# Altium footprint library TO系列封装.PcbLib: 22 footprints (part 1 of 2)
Each footprint in its own frame and in the unit in brackets; x right, y up, seen from the top. Pads: shape width x height; smd on the part's side, far side on the other; paste and mask are expansions set on the pad; w line width, h text height; cw(c..) or ccw(c..) is an arc to the next point about the centre after c.
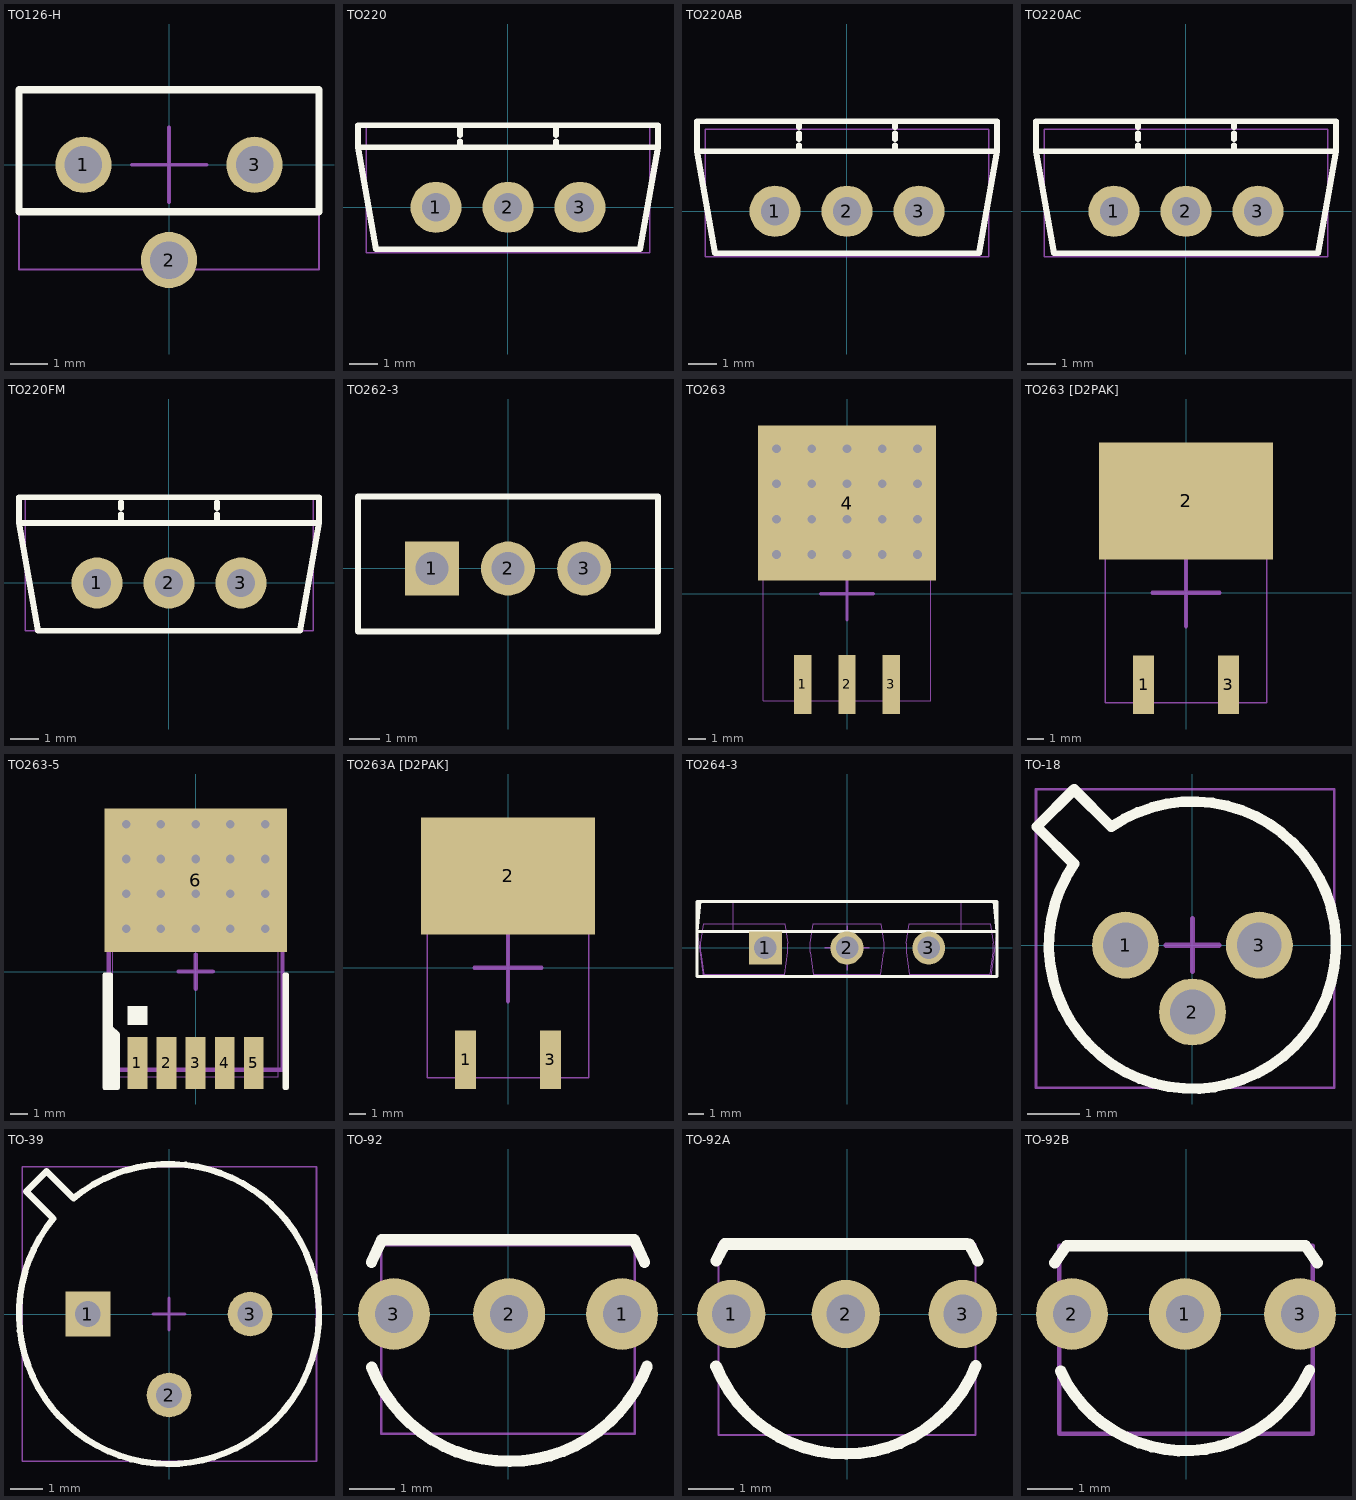
[diagram p0: the footprints below, top view; thin cyan lines are the x and y axes]

## TO126-H [mm] "SOT-32 [TO-126]晶体管"
height 15
pads (3):
  round 1.5 hole 1: 1(-2.28,0) 2(0,-2.54) 3(2.28,0)
Top Overlay:
  lines w0.2: -4,-1.25 4,-1.25 4,2 -4,2 -4,-1.25
Mechanical 13:
  lines w0.05: -4,-2.79 4,-2.79 4,2 -4,2 -4,-2.79
Mechanical 15:
  lines w0.1: -0.991,0 1,0 ; 0,-1 0,1
3D body "to126-cut5-c.stp": height 15.5, standoff -3.5, extent -4,-2.79 4,2

## TO220 [mm]
height 28
pads (3):
  round 1.8 hole 1: 1(-2.54,0) 2(0,0) 3(2.54,0)
Top Overlay:
  lines w0.2: -1.693,2.117 -1.693,2.328 ; -1.693,2.54 -1.693,2.752 ; 1.693,2.117 1.693,2.328 ; 1.693,2.54 1.693,2.752 ; -5.292,2.117 -5.292,2.896 5.292,2.896 5.292,2.117 ; -5.292,2.117 -4.657,-1.482 4.657,-1.482 5.292,2.117 ; -5.292,2.117 5.292,2.117
Mechanical 13:
  lines w0.05: -5,-1.604 5,-1.604 5,2.896 -5,2.896 -5,-1.604
3D body "to220-3p.stp": height 23.7, standoff -5.08, extent -5,-1.604 5,2.896

## TO220AB [mm]
height 28
pads (3):
  round 1.8 hole 1: 1(-2.54,0) 2(0,0) 3(2.54,0)
Top Overlay:
  lines w0.2: -1.693,2.117 -1.693,2.328 ; -1.693,2.54 -1.693,2.752 ; -1.693,2.963 -1.693,3.175 ; 1.693,2.117 1.693,2.328 ; 1.693,2.54 1.693,2.752 ; 1.693,2.963 1.693,3.175 ; -5.292,2.117 5.292,2.117 ; -5.292,2.117 -4.657,-1.482 4.657,-1.482 5.292,2.117 ; -5.292,2.117 -5.292,3.175 5.292,3.175 5.292,2.117
Mechanical 13:
  lines w0.05: -5,-1.604 -5,2.896 5,2.896 5,-1.604 -5,-1.604
3D body "to220ab-3p.stp": height 23.5, standoff -5, extent -5,-1.604 5.2,2.896

## TO220AC [mm]
height 28
pads (3):
  round 1.8 hole 1: 1(-2.54,0) 2(0,0) 3(2.54,0)
Top Overlay:
  lines w0.2: -1.693,2.117 -1.693,2.328 ; -1.693,2.54 -1.693,2.752 ; -1.693,2.963 -1.693,3.175 ; 1.693,2.117 1.693,2.328 ; 1.693,2.54 1.693,2.752 ; 1.693,2.963 1.693,3.175 ; -5.292,2.117 -5.292,3.175 5.292,3.175 5.292,2.117 ; -5.292,2.117 -4.657,-1.482 4.657,-1.482 5.292,2.117 ; -5.292,2.117 5.292,2.117
Mechanical 13:
  lines w0.05: -5,-1.604 5,-1.604 5,2.896 -5,2.896 -5,-1.604
3D body "to220ac-3p.stp": height 23.7, standoff -5.08, extent -5,-1.604 5,2.896

## TO220FM [mm]
height 28
pads (3):
  round 1.8 hole 1: 1(-2.54,0) 2(0,0) 3(2.54,0)
Top Overlay:
  lines w0.2: -1.693,2.218 -1.693,2.43 ; -1.693,2.642 -1.693,2.853 ; 1.693,2.218 1.693,2.43 ; 1.693,2.642 1.693,2.853 ; -5.292,2.117 -5.292,3.019 5.292,3.019 5.292,2.117 ; -5.292,2.117 -4.622,-1.681 4.622,-1.681 5.292,2.117 ; -5.292,2.117 5.292,2.117
Mechanical 13:
  lines w0.05: -5.076,-1.681 5.084,-1.681 5.084,3.019 -5.076,3.019 -5.076,-1.681
3D body "to220f-3p.stp": height 23.87, standoff -4.98, extent -5.076,-1.681 5.084,3.019

## TO262-3 [mm] "TO, Thru-Hole, Vertical, Heatsink Mounted; 3 In-Line Leads; Pitch 2.54 mm"
height 19.7
pads (3):
  rect 1.8x1.8 hole 1.1: 1(-2.54,0)
  round 1.8 hole 1.1: 2(0,0) 3(2.54,0)
Top Overlay:
  lines w0.2: -5,-2.1 5,-2.1 5,2.4 -5,2.4 -5,-2.1
3D body "to262_sot226a.stp": height 18, standoff -6.5, extent -5,-2.1 5,2.4
3D body "to262_sot226a.stp": height 0, standoff 0, extent -3.099,-2.743 -3.099,-2.743
3D body "to262_sot226a.stp": height 0, standoff 0, extent -4.293,-5.893 -4.293,-5.893
3D body "to262_sot226a.stp": height 0, standoff 0, extent -4.343,-2.286 -4.343,-2.286

## TO263 [mm] "D2-PACK SIP-G3/P2.54"
height 5
pads (4):
  rect 1x3.4 smd: 1(-2.54,-5.225) 2(0,-5.225) 3(2.54,-5.225)
  rect 10.25x8.9 smd: 4(0,5.225)
via -4.064,2.261 diameter 0.8 hole 0.5
via -2.032,2.261 diameter 0.8 hole 0.5
via 0,2.261 diameter 0.8 hole 0.5
via 2.032,2.261 diameter 0.8 hole 0.5
via 4.064,2.261 diameter 0.8 hole 0.5
via -4.064,4.293 diameter 0.8 hole 0.5
via -2.032,4.293 diameter 0.8 hole 0.5
via 0,4.293 diameter 0.8 hole 0.5
via 2.032,4.293 diameter 0.8 hole 0.5
via 4.064,4.293 diameter 0.8 hole 0.5
via -4.064,6.325 diameter 0.8 hole 0.5
via -2.032,6.325 diameter 0.8 hole 0.5
via 0,6.325 diameter 0.8 hole 0.5
via 2.032,6.325 diameter 0.8 hole 0.5
via 4.064,6.325 diameter 0.8 hole 0.5
via 4.064,8.357 diameter 0.8 hole 0.5
via 2.032,8.357 diameter 0.8 hole 0.5
via 0,8.357 diameter 0.8 hole 0.5
via -2.032,8.357 diameter 0.8 hole 0.5
via -4.064,8.357 diameter 0.8 hole 0.5
Mechanical 13:
  lines w0.05: -4.834,-6.162 -4.834,8.651 4.826,8.651 4.826,-6.162 -4.834,-6.162
Mechanical 15:
  lines w0.2: -1.5,0 0,0 ; 0,-1.5 0,0 ; 0,1.5 0,0 ; 1.5,0 0,0
3D body "to263-3p.stp": height 4.31, standoff 0, extent -4.834,-6.162 4.826,8.651

## TO263 [D2PAK] [mm] "D2-PAK/TO-263-AB; 3 Leads (1 Cropped); Body 15.5 (inc. leads) x 10.5 mm (LxW max)"
height 4.69
pads (3):
  rect 1.27x3.5 smd: 1(-2.54,-5.5) 3(2.54,-5.5)
  rect 10.41x7.01 smd: 2(0,5.5)
Mechanical 13:
  lines w0.1: -4.83,-6.583 -4.83,8.23 4.83,8.23 4.83,-6.583 -4.83,-6.583
Mechanical 15:
  lines w0.254: -2,0 2,0 ; 0,-2 0,2
3D body "to263-2P.stp": height 4.31, standoff 0, extent -4.83,-6.583 4.83,8.23

## TO263-5 [mm] "TO-263封装稳压集成电路"
height 5
pads (6):
  rect 1.16x3.05 smd: 1(-3.4,-5.343) 2(-1.7,-5.343) 3(0,-5.343) 4(1.7,-5.343) 5(3.4,-5.343)
  rect 10.66x8.38 smd: 6(0,5.343)
via -4.064,8.611 diameter 0.8 hole 0.5
via -2.032,8.611 diameter 0.8 hole 0.5
via 0,8.611 diameter 0.8 hole 0.5
via 2.032,8.611 diameter 0.8 hole 0.5
via 4.064,8.611 diameter 0.8 hole 0.5
via 4.064,6.579 diameter 0.8 hole 0.5
via 2.032,6.579 diameter 0.8 hole 0.5
via 0,6.579 diameter 0.8 hole 0.5
via -2.032,6.579 diameter 0.8 hole 0.5
via -4.064,6.579 diameter 0.8 hole 0.5
via 4.064,4.547 diameter 0.8 hole 0.5
via 2.032,4.547 diameter 0.8 hole 0.5
via 0,4.547 diameter 0.8 hole 0.5
via -2.032,4.547 diameter 0.8 hole 0.5
via -4.064,4.547 diameter 0.8 hole 0.5
via 4.064,2.515 diameter 0.8 hole 0.5
via 2.032,2.515 diameter 0.8 hole 0.5
via 0,2.515 diameter 0.8 hole 0.5
via -2.032,2.515 diameter 0.8 hole 0.5
via -4.064,2.515 diameter 0.8 hole 0.5
Top Overlay:
  region: -5.33,-0.19 -5.33,-6.79 -4.953,-6.79 -4.953,-0.19
  region: -4.953,-3.666 -4.953,-6.79 -4.551,-6.79 -4.551,-3.666
  region: -4.953,-3.391 -4.953,-3.666 -4.801,-3.666 -4.801,-3.391
  region: -4.826,-3.543 -4.826,-3.721 -4.648,-3.721 -4.648,-3.543
  rectangle: -3.988,-3.137 -2.819,-2.019
  lines w0.254: -5.33,-6.79 -5.33,-0.191 -4.953,-0.191 -4.953,-3.264 -4.551,-3.666 -4.551,-6.79 -5.33,-6.79 ; 5.203,-6.79 5.33,-6.79 5.33,-0.191 5.203,-0.191 5.203,-6.79
Mechanical 13:
  lines w0.05: -4.83,-6.164 -4.83,8.649 4.83,8.649 4.83,-6.164 -4.83,-6.164
Mechanical 15:
  lines w0.254: -1,0 1,0 ; 0,-1 0,1 ; -5.08,-5.74 5.08,-5.74 5.08,8.661 -5.08,8.661 -5.08,-5.74
3D body "to263-5P.stp": height 4.16, standoff -0.15, extent -4.83,-6.164 4.83,8.649

## TO263A [D2PAK] [mm] "D2-PAK/TO-263-AB; 3 Leads (1 Cropped); Body 15.5 (inc. leads) x 10.5 mm (LxW max)"
height 4.69
pads (3):
  rect 1.27x3.5 smd: 1(-2.54,-5.5) 3(2.54,-5.5)
  rect 10.41x7.01 smd: 2(0,5.5)
Mechanical 13:
  lines w0.1: -4.83,-6.583 -4.83,8.23 4.83,8.23 4.83,-6.583 -4.83,-6.583
Mechanical 15:
  lines w0.254: -2,0 2,0 ; 0,-2 0,2
3D body "to263a-2p.stp": height 4.31, standoff 0, extent -4.83,-6.583 4.83,8.23

## TO264-3 [mm] "SIP with Mounting Hole; 3 Leads; Body 26 x 20 x 5 mm (typ); Pitch 5.45 mm"
height 29
pads (3):
  rect 2.2x2.2 hole 1.5: 1(-5.45,0)
  round 2.2 hole 1.5: 2(0,0) 3(5.45,0)
Top Overlay:
  lines w0.05: -9.8,3.1 9.8,3.1
  lines w0.2: -9.8,3.1 -10,1.1 10,1.1 9.8,3.1 ; -10,-1.9 -10,3.1 10,3.1 10,-1.9 -10,-1.9
Mechanical 13:
  lines w0.05: -10,-1.9 10,-1.9 10,3.1 -10,3.1 -10,-1.9
Mechanical 15:
  lines w0.05: -9,1.1 -7.6,1.1 -7.6,3.1 ; -7,-1.9 -7,-1.85 ; -5.5,-1.9 -3.5,-1.9 ; 0,-0.3 0,0.3 ; 7,-1.9 7,-1.85 ; 7.6,3.1 7.6,1.1 9,1.1 ; -10,1.1 -9.6,-1.9 9.6,-1.9 10,1.1 ; -10,1.1 -9.8,3.1 9.8,3.1 10,1.1 ; -10,1.1 10,1.1 ; -9.75,-0.3 -9.55,-1.75 -4.15,-1.75 -3.95,-0.3 -3.95,0.3 -4.15,1.6 -9.55,1.6 -9.75,0.3 -9.75,-0.3 ; -2.45,-0.3 -2.25,-1.75 2.25,-1.75 2.45,-0.3 2.45,0.3 2.25,1.6 -2.25,1.6 -2.45,0.3 -2.45,-0.3 ; 3.95,-0.3 4.15,-1.75 9.55,-1.75 9.75,-0.3 9.75,0.3 9.55,1.6 4.15,1.6 3.95,0.3 3.95,-0.3
  lines w0.1: -1.499,0 1.5,0 ; 0,-1.5 0,1.5
3D body "to264.stp": height 36, standoff -10, extent -10,-1.9 10,3.1

## TO-18 [mm]
height 8
pads (3):
  round 1.27 hole 0.85: 1(-1.27,0) 2(0,-1.27) 3(1.27,0)
Top Overlay:
  lines w0.2: -2.955,2.248 -2.248,2.955 -1.541,2.248 cw(c0,0) -2.248,1.541 -2.955,2.248
Mechanical 13:
  lines w0.05: -2.97,-2.704 -2.97,2.958 2.692,2.958 2.692,-2.704 -2.97,-2.704
Mechanical 15:
  lines w0.1: -0.5,0 0.5,0 ; 0,-0.5 0,0.5
3D body "to-18.stp": height 7.31, standoff -5.45, extent -2.97,-2.704 2.692,2.958

## TO-39 [mm] "Can; 3 Leads; Pin Circle Dia. 5.08 mm; Lead Dia. 0.48 mm (max)"
height 4.55
pads (3):
  rect 1.4x1.4 hole 0.8: 1(-2.54,0)
  round 1.4 hole 0.8: 2(0,-2.54) 3(2.54,0)
Top Overlay:
  lines w0.2: -4.475,3.838 -3.838,4.475 -2.99,3.626 cw(c0,0) -3.626,2.99 -4.475,3.838
Mechanical 13:
  lines w0.05: -4.6,-4.612 4.623,-4.612 4.623,4.612 -4.6,4.612 -4.6,-4.612
Mechanical 15:
  lines w0.1: -0.5,0 0.5,0 ; 0,-0.5 0,0.5
3D body "to-39.stp": height 6.98, standoff -3.5, extent -4.6,-4.612 4.623,4.612

## TO-92 [mm] "晶体管"
height 10
pads (3):
  round 1.6 hole 0.85: 1(2.54,0) 2(0.025,0) 3(-2.54,0)
Top Overlay:
  lines w0.25: -3.04,1.153 -2.81,1.651 ; 2.81,1.651 3.04,1.153
  lines w0.254: -3.035,-1.187 ccw(c0.025,0) 3.096,-1.161 ; -2.81,1.651 2.81,1.651
Mechanical 11:
  lines w0.1: -0.5,0 0.5,0 ; 0,-0.5 0,0.5
Mechanical 13:
  lines w0.05: -2.82,-2.666 -2.82,1.524 2.82,1.524 2.82,-2.666 -2.82,-2.666
Mechanical 15:
  lines w0.1: -0.5,0 0.5,0 ; 0,-0.5 0,0.5
3D body "to92-cut-5.stp": height 9.43, standoff -3.9, extent -2.82,-2.666 2.82,1.524

## TO-92A [mm]
height 10
pads (3):
  round 1.5 hole 0.85: 1(-2.54,0) 2(-0.025,0) 3(2.54,0)
Top Overlay:
  lines w0.25: -2.87,1.168 -2.683,1.535 ; 2.683,1.535 2.87,1.168
  lines w0.254: -2.873,-1.144 ccw(c-0.025,0) 2.826,-1.135 ; -2.683,1.535 2.633,1.535 ; 2.633,1.535 2.633,1.535
Mechanical 11:
  lines w0.1: -0.5,0 0.5,0 ; 0,-0.5 0,0.5
Mechanical 13:
  lines w0.05: -2.82,-2.655 -2.82,1.535 2.82,1.535 2.82,-2.655 -2.82,-2.655
Mechanical 15:
  lines w0.1: -0.5,0 0.5,0 ; 0,-0.5 0,0.5
3D body "to92-cut-5.stp": height 9.43, standoff -3.9, extent -2.82,-2.655 2.82,1.535

## TO-92B [mm]
height 10
pads (3):
  round 1.6 hole 0.85: 1(-0.025,0) 2(-2.54,0) 3(2.54,0)
Top Overlay:
  lines w0.25: -2.921,1.143 -2.662,1.522 ; 2.662,1.522 2.921,1.143
  lines w0.254: -2.792,-1.269 ccw(c-0.025,0) 2.75,-1.25 ; -2.662,1.522 2.611,1.522
Mechanical 11:
  lines w0.1: -0.5,0 0.5,0 ; 0,-0.5 0,0.5
Mechanical 13:
  lines w0.1: -2.82,-2.668 -2.82,1.522 2.82,1.522 2.82,-2.668 -2.82,-2.668
Mechanical 15:
  lines w0.1: -0.5,0 0.5,0 ; 0,-0.5 0,0.5
3D body "to92-cut-5.stp": height 9.53, standoff -3.8, extent -2.82,-2.668 2.82,1.522